# Altium footprint library ICs And Semiconductors THD.PcbLib: 350 footprints (part 17 of 22)
Each footprint in its own frame and in the unit in brackets; x right, y up, seen from the top. Pads: shape width x height; smd on the part's side, far side on the other; paste and mask are expansions set on the pad; w line width, h text height; cw(c..) or ccw(c..) is an arc to the next point about the centre after c.
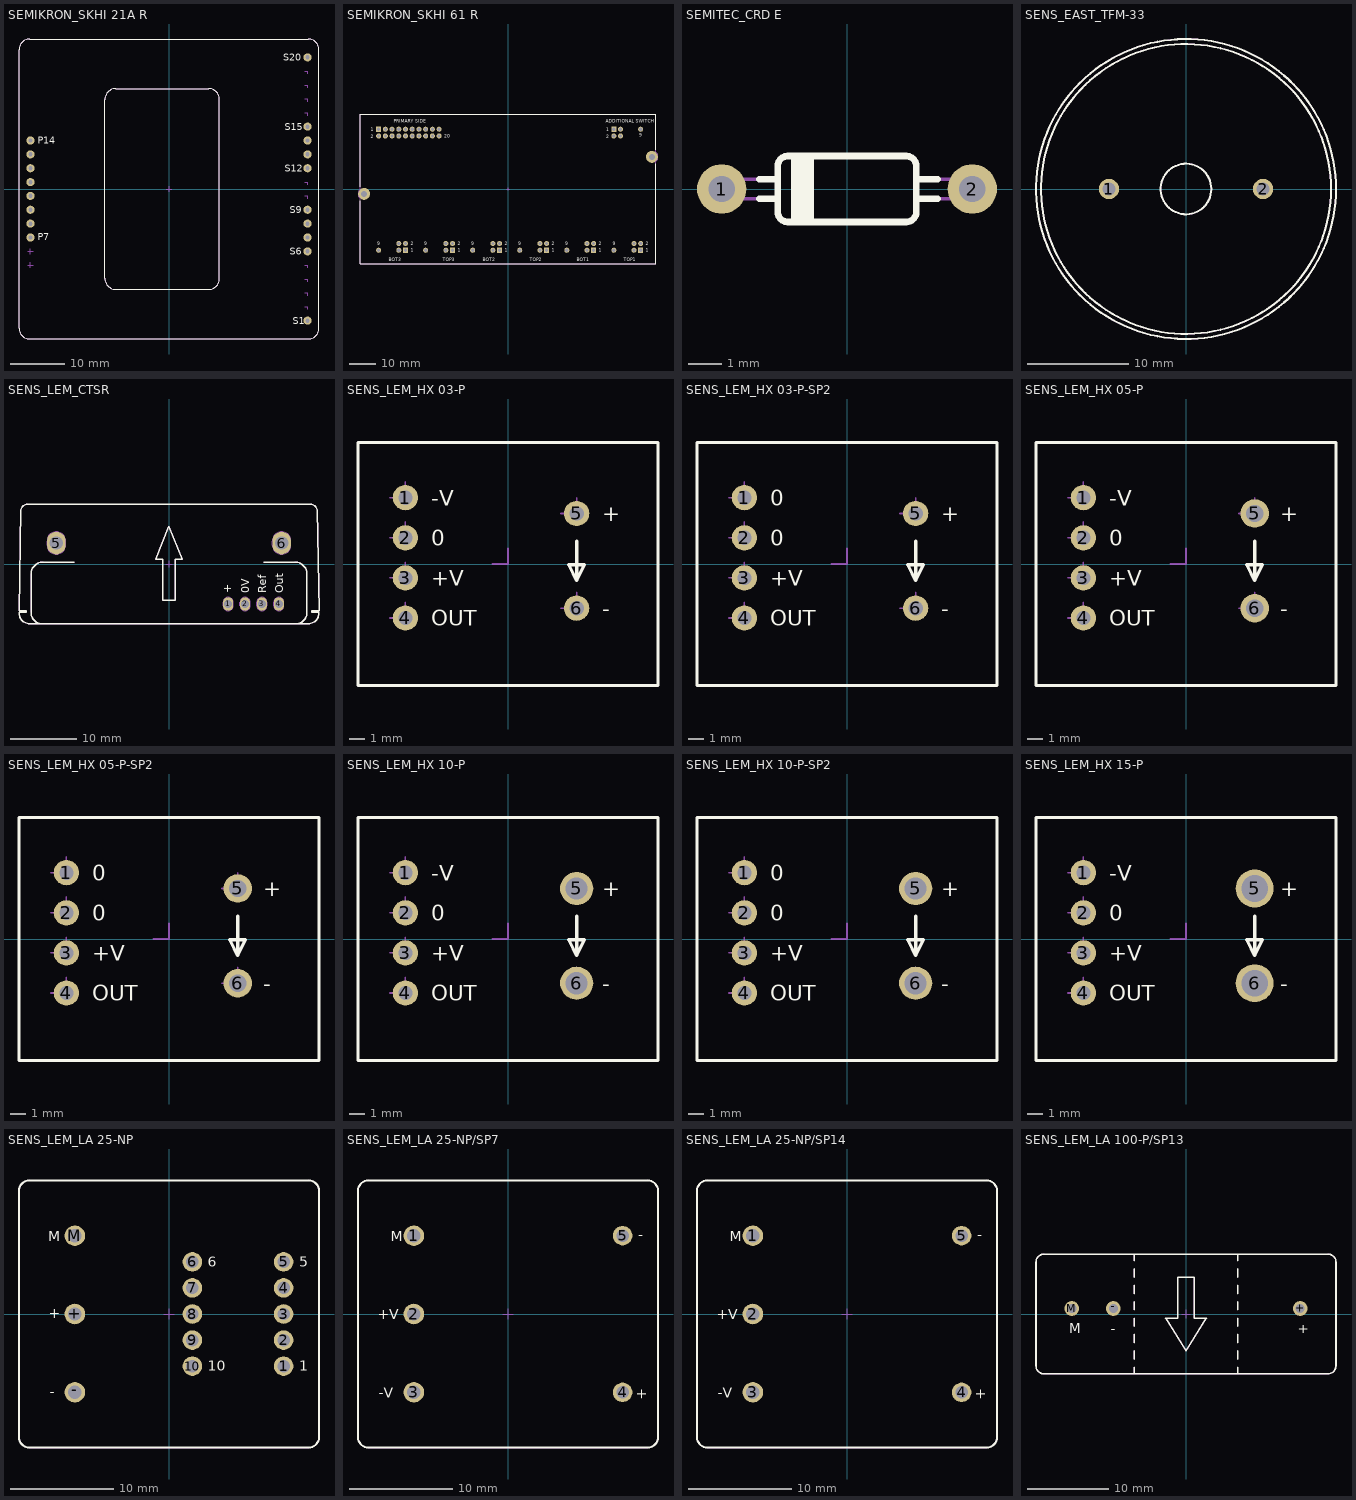
[diagram p16: the footprints below, top view; thin cyan lines are the x and y axes]

## SEMIKRON_SKHI 21A R [mm] "SEMIKRON SKHI 21A R Case"
height 16
pads (18):
  round 1.5 hole 0.8: P7(-25.4,-8.89) P8(-25.4,-6.35) P9(-25.4,-3.81) P10(-25.4,-1.27) P11(-25.4,1.27) P12(-25.4,3.81) P13(-25.4,6.35) P14(-25.4,8.89) S1(25.4,-24.13) S6(25.4,-11.43) S7(25.4,-8.89) S8(25.4,-6.35) S9(25.4,-3.81) S12(25.4,3.81) S13(25.4,6.35) S14(25.4,8.89) S15(25.4,11.43) S20(25.4,24.13)
Top Overlay:
  lines w0.2: -27.5,-25.5 ccw(c-25.5,-25.5) -25.5,-27.5 25.5,-27.5 ccw(c25.5,-25.5) 27.5,-25.5 27.5,25.5 ccw(c25.5,25.5) 25.5,27.5 -25.5,27.5 ccw(c-25.5,25.5) -27.5,25.5 -27.5,-25.5 ; -11.75,-16.4 ccw(c-9.75,-16.4) -9.75,-18.4 7.25,-18.4 ccw(c7.25,-16.4) 9.25,-16.4 9.25,16.4 ccw(c7.25,16.4) 7.25,18.4 -9.75,18.4 ccw(c-9.75,16.4) -11.75,16.4 -11.75,-16.4
  text "P7" at -24.08,-9.44 h1.27
  text "P14" at -24.08,8.34 h1.27
  text "S20" at 20.98,23.48 h1.27
  text "S15" at 21.18,10.78 h1.27
  text "S12" at 21.227,3.16 h1.27
  text "S9" at 22.18,-4.46 h1.27
  text "S6" at 22.18,-12.08 h1.27
  text "S1" at 22.68,-24.78 h1.27
Notvisible:
  lines w0.1: -25.9,-13.97 -25.4,-13.97 ; -25.9,-11.43 -25.4,-11.43 ; -25.9,-8.89 -25.4,-8.89 ; -25.9,-6.35 -25.4,-6.35 ; -25.9,-3.81 -25.4,-3.81 ; -25.9,-1.27 -25.4,-1.27 ; -25.9,1.27 -25.4,1.27 ; -25.9,3.81 -25.4,3.81 ; -25.9,6.35 -25.4,6.35 ; -25.9,8.89 -25.4,8.89 ; -25.4,-14.47 -25.4,-13.97 ; -25.4,-13.47 -25.4,-13.97 ; -25.4,-11.93 -25.4,-11.43 ; -25.4,-10.93 -25.4,-11.43 ; -25.4,-9.39 -25.4,-8.89 ; -25.4,-8.39 -25.4,-8.89 ; -25.4,-6.85 -25.4,-6.35 ; -25.4,-5.85 -25.4,-6.35 ; -25.4,-4.31 -25.4,-3.81 ; -25.4,-3.31 -25.4,-3.81 ; -25.4,-1.77 -25.4,-1.27 ; -25.4,-0.77 -25.4,-1.27 ; -25.4,0.77 -25.4,1.27 ; -25.4,1.77 -25.4,1.27 ; -25.4,3.31 -25.4,3.81 ; -25.4,4.31 -25.4,3.81 ; -25.4,5.85 -25.4,6.35 ; -25.4,6.85 -25.4,6.35 ; -25.4,8.39 -25.4,8.89 ; -25.4,9.39 -25.4,8.89 ; -24.9,-13.97 -25.4,-13.97 ; -24.9,-11.43 -25.4,-11.43 ; -24.9,-8.89 -25.4,-8.89 ; -24.9,-6.35 -25.4,-6.35 ; -24.9,-3.81 -25.4,-3.81 ; -24.9,-1.27 -25.4,-1.27 ; -24.9,1.27 -25.4,1.27 ; -24.9,3.81 -25.4,3.81 ; -24.9,6.35 -25.4,6.35 ; -24.9,8.89 -25.4,8.89 ; -0.5,0 0,0 ; 0,-0.5 0,0 ; 0,0.5 0,0 ; 0.5,0 0,0 ; 24.9,-24.13 25.4,-24.13 ; 24.9,-21.59 25.4,-21.59 25.4,-22.09 ; 24.9,-19.05 25.4,-19.05 25.4,-19.55 ; 24.9,-16.51 25.4,-16.51 25.4,-17.01 ; 24.9,-13.97 25.4,-13.97 25.4,-14.47 ; 24.9,-11.43 25.4,-11.43 ; 24.9,-8.89 25.4,-8.89 ; 24.9,-6.35 25.4,-6.35 ; 24.9,-3.81 25.4,-3.81 ; 24.9,-1.27 25.4,-1.27 25.4,-1.77 ; 24.9,1.27 25.4,1.27 25.4,0.77 ; 24.9,3.81 25.4,3.81 ; 24.9,6.35 25.4,6.35 ; 24.9,8.89 25.4,8.89 ; 24.9,11.43 25.4,11.43 ; 24.9,13.97 25.4,13.97 25.4,13.47 ; 24.9,16.51 25.4,16.51 25.4,16.01 ; 24.9,19.05 25.4,19.05 25.4,18.55 ; 24.9,21.59 25.4,21.59 25.4,21.09 ; 24.9,24.13 25.4,24.13 ; 25.4,-24.63 25.4,-24.13 ; 25.4,-23.63 25.4,-24.13 ; 25.4,-11.93 25.4,-11.43 ; 25.4,-10.93 25.4,-11.43 ; 25.4,-9.39 25.4,-8.89 ; 25.4,-8.39 25.4,-8.89 ; 25.4,-6.85 25.4,-6.35 ; 25.4,-5.85 25.4,-6.35 ; 25.4,-4.31 25.4,-3.81 ; 25.4,-3.31 25.4,-3.81 ; 25.4,3.31 25.4,3.81 ; 25.4,4.31 25.4,3.81 ; 25.4,5.85 25.4,6.35 ; 25.4,6.85 25.4,6.35 ; 25.4,8.39 25.4,8.89 ; 25.4,9.39 25.4,8.89 ; 25.4,10.93 25.4,11.43 ; 25.4,11.93 25.4,11.43 ; 25.4,23.63 25.4,24.13 ; 25.4,24.63 25.4,24.13 ; 25.9,-24.13 25.4,-24.13 ; 25.9,-11.43 25.4,-11.43 ; 25.9,-8.89 25.4,-8.89 ; 25.9,-6.35 25.4,-6.35 ; 25.9,-3.81 25.4,-3.81 ; 25.9,3.81 25.4,3.81 ; 25.9,6.35 25.4,6.35 ; 25.9,8.89 25.4,8.89 ; 25.9,11.43 25.4,11.43 ; 25.9,24.13 25.4,24.13
Mechanical 14:
  lines w0.1: -27.5,-25.5 ccw(c-25.5,-25.5) -25.5,-27.5 25.5,-27.5 ccw(c25.5,-25.5) 27.5,-25.5 27.5,25.5 ccw(c25.5,25.5) 25.5,27.5 -25.5,27.5 ccw(c-25.5,25.5) -27.5,25.5 -27.5,-25.5 ; -11.75,-16.4 ccw(c-9.75,-16.4) -9.75,-18.4 7.25,-18.4 ccw(c7.25,-16.4) 9.25,-16.4 9.25,16.4 ccw(c7.25,16.4) 7.25,18.4 -9.75,18.4 ccw(c-9.75,16.4) -11.75,16.4 -11.75,-16.4
  text "P7" at -24.08,-9.44 h1.27
  text "P14" at -24.08,8.34 h1.27
  text "S20" at 20.98,23.48 h1.27
  text "S15" at 21.18,10.78 h1.27
  text "S12" at 21.227,3.16 h1.27
  text "S9" at 22.18,-4.46 h1.27
  text "S6" at 22.18,-12.08 h1.27
  text "S1" at 22.68,-24.78 h1.27
3D body "SEMIKRON_SKHI 21A R.stp": height 16, standoff -3.5, extent -27.5,-27.5 27.5,27.5

## SEMIKRON_SKHI 61 R [mm] "SEMIKRON SKHI 61 R Case"
height 20
pads (57):
  rect 1.9x1.9 hole 1.2: 1(-48.9,22.59) AS-1(40,22.59) B1-1(32.38,-23.15) B2-1(-3.18,-23.15) B3-1(-38.74,-23.15) T1-1(50.16,-23.15) T2-1(14.6,-23.15) T3-1(-20.96,-23.15)
  round 1.9 hole 1.2: 2(-48.9,20.05) 3(-46.36,22.59) 4(-46.36,20.05) 5(-43.82,22.59) 6(-43.82,20.05) 7(-41.28,22.59) 8(-41.28,20.05) 9(-38.74,22.59) 10(-38.74,20.05) 11(-36.2,22.59) 12(-36.2,20.05) 13(-33.66,22.59) 14(-33.66,20.05) 15(-31.12,22.59) 16(-31.12,20.05) 17(-28.58,22.59) 18(-28.58,20.05) 19(-26.04,22.59) 20(-26.04,20.05) AS-2(40,20.05) AS-3(42.54,22.59) AS-4(42.54,20.05) AS-9(50.16,22.59) B1-2(32.38,-20.61) B1-3(29.84,-23.15) B1-4(29.84,-20.61) B1-9(22.22,-23.15) B2-2(-3.18,-20.61) B2-3(-5.72,-23.15) B2-4(-5.72,-20.61) B2-9(-13.34,-23.15) B3-2(-38.74,-20.61) B3-3(-41.28,-23.15) B3-4(-41.28,-20.61) B3-9(-48.9,-23.15) T1-2(50.16,-20.61) T1-3(47.62,-23.15) T1-4(47.62,-20.61) T1-9(40,-23.15) T2-2(14.6,-20.61) T2-3(12.06,-23.15) T2-4(12.06,-20.61) T2-9(4.44,-23.15) T3-2(-20.96,-20.61) T3-3(-23.5,-23.15) T3-4(-23.5,-20.61) T3-9(-31.12,-23.15)
  round 4.5 hole 2.2: MECH1(-54.4,-1.85) MECH2(54.4,12.15)
Top Overlay:
  lines w0.2: -55.9,-4.506 -55.9,-28.35 55.9,-28.35 55.9,9.494 ; -55.9,0.806 -55.9,28.35 55.9,28.35 55.9,14.806
  text "20" at -24.11,19.4 h1.2
  text "1" at -51.8,21.79 h1.2
  text "2" at -51.8,19.25 h1.2
  text "PRIMARY SIDE" at -43.15,25.04 h1.2
  text "ADDITIONAL SWITCH" at 36.86,25.04 h1.2
  text "BOT3" at -45.06,-27.32 h1.2
  text "TOP3" at -24.74,-27.32 h1.2
  text "BOT2" at -9.5,-27.32 h1.2
  text "TOP2" at 8.28,-27.32 h1.2
  text "BOT1" at 26.06,-27.32 h1.2
  text "TOP1" at 43.84,-27.32 h1.2
  text "1" at -36.81,-23.8 h1.2
  text "2" at -36.81,-21.26 h1.2
  text "2" at -19.03,-21.26 h1.2
  text "1" at -19.03,-23.8 h1.2
  text "2" at -1.25,-21.26 h1.2
  text "1" at -1.25,-23.8 h1.2
  text "2" at 16.53,-21.26 h1.2
  text "1" at 16.53,-23.8 h1.2
  text "2" at 34.31,-21.26 h1.2
  text "1" at 34.31,-23.8 h1.2
  text "2" at 52.09,-21.26 h1.2
  text "1" at 52.09,-23.8 h1.2
  text "9" at -31.606,-21.26 h1.2
  text "9" at -49.386,-21.26 h1.2
  text "9" at -13.826,-21.26 h1.2
  text "9" at 3.954,-21.26 h1.2
  text "9" at 21.734,-21.26 h1.2
  text "9" at 39.514,-21.26 h1.2
  text "9" at 49.674,19.67 h1.2
  text "2" at 37.1,19.25 h1.2
  text "1" at 37.1,21.79 h1.2
Notvisible:
  drawing of 232 lines, arcs and shapes, not listed
Mechanical 14:
  lines w0.1: -55.9,-28.35 55.9,-28.35 55.9,10.406 ccw(c54.4,12.15) 55.9,13.894 55.9,28.35 -55.9,28.35 -55.9,-0.106 ccw(c-54.4,-1.85) -55.9,-3.594 -55.9,-28.35
  text "20" at -24.11,19.4 h1.2
  text "1" at -51.8,21.79 h1.2
  text "2" at -51.8,19.25 h1.2
  text "PRIMARY SIDE" at -43.15,25.04 h1.2
  text "ADDITIONAL SWITCH" at 36.86,25.04 h1.2
  text "BOT3" at -45.06,-27.32 h1.2
  text "TOP3" at -24.74,-27.32 h1.2
  text "BOT2" at -9.5,-27.32 h1.2
  text "TOP2" at 8.28,-27.32 h1.2
  text "BOT1" at 26.06,-27.32 h1.2
  text "TOP1" at 43.84,-27.32 h1.2
  text "1" at -36.81,-23.8 h1.2
  text "2" at -36.81,-21.26 h1.2
  text "2" at -19.03,-21.26 h1.2
  text "1" at -19.03,-23.8 h1.2
  text "2" at -1.25,-21.26 h1.2
  text "1" at -1.25,-23.8 h1.2
  text "2" at 16.53,-21.26 h1.2
  text "1" at 16.53,-23.8 h1.2
  text "2" at 34.31,-21.26 h1.2
  text "1" at 34.31,-23.8 h1.2
  text "2" at 52.09,-21.26 h1.2
  text "1" at 52.09,-23.8 h1.2
  text "9" at -31.606,-21.26 h1.2
  text "9" at -49.386,-21.26 h1.2
  text "9" at -13.826,-21.26 h1.2
  text "9" at 3.954,-21.26 h1.2
  text "9" at 21.734,-21.26 h1.2
  text "9" at 39.514,-21.26 h1.2
  text "9" at 49.674,19.67 h1.2
  text "2" at 37.1,19.25 h1.2
  text "1" at 37.1,21.79 h1.2
3D body "SEMIKRON_SKHI 61 R.stp": height 20, standoff -3.2, extent -56.7,-28.35 56.7,28.35

## SEMITEC_CRD E [mm] "CRD Diode, Lead spacing 7.62mm Body 4.2mm X 2mm, SEMITEC Case Type CRD E"
height 2
pads (2):
  round 1.5 hole 0.8: 1(-3.8,0) 2(3.8,0)
Top Overlay:
  lines w0.2: -2.66,-0.3 -2.1,-0.3 ; -2.66,0.3 -2.1,0.3 ; -1.6,-1 -1.6,1 ; -1.5,-1 -1.5,1 ; -1.4,-1 -1.4,1 ; -1.3,-1 -1.3,1 ; -1.2,-1 -1.2,1 ; -1.1,-1 -1.1,1 ; 2.1,-0.3 2.752,-0.3 ; 2.1,0.3 2.752,0.3 ; -2.1,-0.7 ccw(c-1.8,-0.7) -1.8,-1 1.8,-1 ccw(c1.8,-0.7) 2.1,-0.7 2.1,0.7 ccw(c1.8,0.7) 1.8,1 -1.8,1 ccw(c-1.8,0.7) -2.1,0.7 -2.1,-0.7
Mechanical 14:
  lines w0.1: -2.1,-0.3 -3.81,-0.3 cw(c-3.81,0) -3.81,0.3 -2.1,0.3 ; -1.6,-1 -1.6,1 ; -1.55,-1 -1.55,1 ; -1.5,-1 -1.5,1 ; -1.45,-1 -1.45,1 ; -1.4,-1 -1.4,1 ; -1.35,-1 -1.35,1 ; -1.3,-1 -1.3,1 ; -1.25,-1 -1.25,1 ; -1.2,-1 -1.2,1 ; -1.15,-1 -1.15,1 ; -1.1,-1 -1.1,1 ; 2.1,-0.3 3.81,-0.3 ccw(c3.81,0) 3.81,0.3 2.1,0.3 ; -2.1,-0.7 ccw(c-1.8,-0.7) -1.8,-1 1.8,-1 ccw(c1.8,-0.7) 2.1,-0.7 2.1,0.7 ccw(c1.8,0.7) 1.8,1 -1.8,1 ccw(c-1.8,0.7) -2.1,0.7 -2.1,-0.7
3D body "E-103.stp": height 2, standoff -3.1, extent -4.11,-1 4.11,1

## SENS_EAST_TFM-33 [mm] "EAST Piezo Transducer, Body Dia. 29.6mm, Pitch 15.2mm"
height 7.5
pads (2):
  round 2 hole 1.3: 1(-7.6,0) 2(7.6,0)
Top Overlay:
  circle w0.2: c0,0 r2.5
  circle w0.2: c0,0 r14.3
  circle w0.2: c0,0 r14.8
Mechanical 14:
  circle w0.1: c0,0 r14.8
  circle w0.1: c0,0 r14.3
  circle w0.1: c0,0 r2.5
  circle w0.1: c7.6,0 r0.5
  circle w0.1: c-7.6,0 r0.5
3D body "SENS_EAST_TFM-33.stp": height 7.5, standoff -3.6, extent -14.8,-14.778 14.8,14.778

## SENS_LEM_CTSR [mm] "LEM Current Transducer, Body 45x17.9mm, CTSR Series"
height 44.6
pads (6):
  oval 1.524x2.032 hole 1.2: 1(8.868,-6) 2(11.408,-6) 3(13.948,-6) 4(16.488,-6)
  oval 2.8x3.4 hole 2: 5(-16.902,3.15) 6(16.898,3.15)
Top Overlay:
  lines w0.2: -19.07,-8.95 cw(c-19.057,-7.317) -20.687,-7.23 -20.687,-1.5 cw(c-18.887,-1.5) -18.887,0.3 -14.188,0.3 ; 14.188,0.3 18.887,0.3 cw(c18.887,-1.5) 20.687,-1.5 20.687,-7.23 cw(c19.057,-7.317) 19.07,-8.95 ; -22.505,-7 -21.395,-6.989 -21.4,-7.239 -22.5,-7.25 -22.495,-7.406 ccw(c-20.896,-7.35) -20.896,-8.95 20.896,-8.95 ccw(c20.896,-7.35) 22.495,-7.406 22.5,-7.25 21.4,-7.25 21.396,-7 22.505,-7 22.24,8.15 ccw(c21.23,7.913) 21.244,8.95 -21.244,8.95 ccw(c-21.244,7.95) -22.223,8.15 -22.505,-7 ; -2.004,0.75 -0.005,5.699 2.004,0.75 0.909,0.75 0.909,-5.45 -0.909,-5.45 -0.909,0.75 -2.004,0.75
  text "Out" at 17.113,-4.385 h1.2
  text "Ref" at 14.573,-4.385 h1.2
  text "0V" at 12.033,-4.385 h1.2
  text "+" at 9.368,-4.36 h1.2
Notvisible:
  circle w0.1: c8.868,-6 r0.6
  circle w0.1: c11.408,-6 r0.6
  circle w0.1: c13.948,-6 r0.6
  circle w0.1: c16.488,-6 r0.6
  circle w0.1: c16.898,3.15 r1
  circle w0.1: c-16.902,3.15 r1
  lines w0.1: -17.402,2.85 -16.902,2.85 ; -17.402,3.45 -16.902,3.45 ; -17.256,2.796 -16.902,3.15 ; -17.256,3.504 -16.902,3.15 ; -16.902,2.35 -16.902,2.85 ; -16.902,3.95 -16.902,3.45 ; -16.549,2.796 -16.902,3.15 ; -16.549,3.504 -16.902,3.15 ; -16.402,2.85 -16.902,2.85 ; -16.402,3.45 -16.902,3.45 ; -0.5,0 0,0 ; 0,-0.5 0,0 ; 0,0.5 0,0 ; 0.5,0 0,0 ; 8.368,-6.262 8.868,-6.262 ; 8.368,-5.746 8.868,-5.746 ; 8.514,-6.354 8.868,-6 ; 8.514,-5.646 8.868,-6 ; 8.868,-6.762 8.868,-6.262 ; 8.868,-5.246 8.868,-5.746 ; 9.221,-6.354 8.868,-6 ; 9.221,-5.646 8.868,-6 ; 9.368,-6.262 8.868,-6.262 ; 9.368,-5.746 8.868,-5.746 ; 10.908,-6.262 11.408,-6.262 ; 10.908,-5.746 11.408,-5.746 ; 11.054,-6.354 11.408,-6 ; 11.054,-5.646 11.408,-6 ; 11.408,-6.762 11.408,-6.262 ; 11.408,-5.246 11.408,-5.746 ; 11.761,-6.354 11.408,-6 ; 11.761,-5.646 11.408,-6 ; 11.908,-6.262 11.408,-6.262 ; 11.908,-5.746 11.408,-5.746 ; 13.448,-6.262 13.948,-6.262 ; 13.448,-5.746 13.948,-5.746 ; 13.594,-6.354 13.948,-6 ; 13.594,-5.646 13.948,-6 ; 13.948,-6.762 13.948,-6.262 ; 13.948,-5.246 13.948,-5.746 ; 14.301,-6.354 13.948,-6 ; 14.301,-5.646 13.948,-6 ; 14.448,-6.262 13.948,-6.262 ; 14.448,-5.746 13.948,-5.746 ; 15.988,-6.262 16.488,-6.262 ; 15.988,-5.746 16.488,-5.746 ; 16.134,-6.354 16.488,-6 ; 16.134,-5.646 16.488,-6 ; 16.398,2.85 16.898,2.85 ; 16.398,3.45 16.898,3.45 ; 16.488,-6.762 16.488,-6.262 ; 16.488,-5.246 16.488,-5.746 ; 16.544,2.796 16.898,3.15 ; 16.544,3.504 16.898,3.15 ; 16.841,-6.354 16.488,-6 ; 16.841,-5.646 16.488,-6 ; 16.898,2.35 16.898,2.85 ; 16.898,3.95 16.898,3.45 ; 16.988,-6.262 16.488,-6.262 ; 16.988,-5.746 16.488,-5.746 ; 17.251,2.796 16.898,3.15 ; 17.251,3.504 16.898,3.15 ; 17.398,2.85 16.898,2.85 ; 17.398,3.45 16.898,3.45 ; -18.302,2.85 ccw(c-16.902,2.85) -15.502,2.85 -15.502,3.45 ccw(c-16.902,3.45) -18.302,3.45 -18.302,2.85 ; 8.106,-6.262 ccw(c8.868,-6.262) 9.63,-6.262 9.63,-5.746 ccw(c8.868,-5.746) 8.106,-5.746 8.106,-6.262 ; 10.646,-6.262 ccw(c11.408,-6.262) 12.17,-6.262 12.17,-5.746 ccw(c11.408,-5.746) 10.646,-5.746 10.646,-6.262 ; 13.186,-6.262 ccw(c13.948,-6.262) 14.71,-6.262 14.71,-5.746 ccw(c13.948,-5.746) 13.186,-5.746 13.186,-6.262 ; 15.498,2.85 ccw(c16.898,2.85) 18.298,2.85 18.298,3.45 ccw(c16.898,3.45) 15.498,3.45 15.498,2.85 ; 15.726,-6.262 ccw(c16.488,-6.262) 17.25,-6.262 17.25,-5.746 ccw(c16.488,-5.746) 15.726,-5.746 15.726,-6.262
Mechanical 14:
  lines w0.1: -19.07,-8.95 cw(c-19.057,-7.317) -20.687,-7.23 -20.687,-1.5 cw(c-18.887,-1.5) -18.887,0.3 -14.188,0.3 ; 14.188,0.3 18.887,0.3 cw(c18.887,-1.5) 20.687,-1.5 20.687,-7.23 cw(c19.057,-7.317) 19.07,-8.95 ; -22.505,-7 -21.395,-6.989 -21.4,-7.239 -22.5,-7.25 -22.495,-7.406 ccw(c-20.896,-7.35) -20.896,-8.95 20.896,-8.95 ccw(c20.896,-7.35) 22.495,-7.406 22.5,-7.25 21.4,-7.25 21.396,-7 22.505,-7 22.24,8.15 ccw(c21.23,7.913) 21.244,8.95 -21.244,8.95 ccw(c-21.244,7.95) -22.223,8.15 -22.505,-7 ; -2.004,0.75 -0.005,5.699 2.004,0.75 0.909,0.75 0.909,-5.45 -0.909,-5.45 -0.909,0.75 -2.004,0.75
  text "Out" at 17.113,-4.385 h1.2
  text "Ref" at 14.573,-4.385 h1.2
  text "0V" at 12.033,-4.385 h1.2
  text "+" at 9.368,-4.36 h1.2
3D body "SENS_LEM_CTSR.stp": height 44.56, standoff -3.5, extent -22.505,-8.95 22.505,8.95

## SENS_LEM_HX 03-P [mm] "LEM Current Transducer, Body 19x15.4mm (max)"
height 20
pads (6):
  round 1.6 hole 0.9: 1(-6.5,4.2) 2(-6.5,1.66) 3(-6.5,-0.88) 4(-6.5,-3.42) 5(4.35,3.2) 6(4.35,-2.8)
Top Overlay:
  lines w0.2: 4.35,1.45 4.35,-1.05 ; 4.35,-1.05 3.85,-0.05 4.85,-0.05 4.35,-1.05 ; -9.5,-7.7 9.5,-7.7 9.5,7.7 -9.5,7.7 -9.5,-7.7
  text "-V" at -4.865,3.7 h1
  text "0" at -4.865,1.16 h1
  text "+V" at -4.865,-1.38 h1
  text "OUT" at -4.865,-3.92 h1
  text "+" at 5.985,2.7 h1
  text "-" at 5.985,-3.3 h1
Notvisible:
  circle w0.1: c4.35,3.2 r0.3
  circle w0.1: c4.35,-2.8 r0.3
  lines w0.1: -7.5,-3.42 -6.5,-3.42 -6.5,-2.42 ; -7.5,-0.88 -6.5,-0.88 -6.5,0.12 ; -7.5,1.66 -6.5,1.66 -6.5,2.66 ; -7.5,4.2 -6.5,4.2 -6.5,5.2 ; -1,0 0,0 0,1 ; 3.35,-2.8 4.35,-2.8 4.35,-1.8 ; 3.35,3.2 4.35,3.2 4.35,4.2 ; -6.625,-3.67 -6.375,-3.67 -6.375,-3.17 -6.625,-3.17 -6.625,-3.67 ; -6.625,-1.13 -6.375,-1.13 -6.375,-0.63 -6.625,-0.63 -6.625,-1.13 ; -6.625,1.41 -6.375,1.41 -6.375,1.91 -6.625,1.91 -6.625,1.41 ; -6.625,3.95 -6.375,3.95 -6.375,4.45 -6.625,4.45 -6.625,3.95
Mechanical 14:
  lines w0.1: 4.35,1.45 4.35,-1.05 ; 4.35,-1.05 4.85,-0.05 3.85,-0.05 4.35,-1.05 ; -9.5,-7.7 -9.5,7.7 9.5,7.7 9.5,-7.7 -9.5,-7.7
  text "OUT" at -4.865,-3.92 h1
  text "+V" at -4.865,-1.38 h1
  text "0" at -4.865,1.16 h1
  text "-V" at -4.865,3.7 h1
  text "+" at 5.985,2.7 h1
  text "-" at 5.985,-3.3 h1
3D body "SENS_LEM_HX 03-P.stp": height 20, standoff -4, extent -9.5,-7.7 9.5,7.7

## SENS_LEM_HX 03-P-SP2 [mm] "LEM Current Transducer, Body 19x15.4mm (max)"
height 20
pads (6):
  round 1.6 hole 0.9: 1(-6.5,4.2) 2(-6.5,1.66) 3(-6.5,-0.88) 4(-6.5,-3.42) 5(4.35,3.2) 6(4.35,-2.8)
Top Overlay:
  lines w0.2: 4.35,1.45 4.35,-1.05 ; 4.35,-1.05 4.85,-0.05 3.85,-0.05 4.35,-1.05 ; -9.5,-7.7 -9.5,7.7 9.5,7.7 9.5,-7.7 -9.5,-7.7
  text "-" at 5.985,-3.3 h1
  text "+" at 5.985,2.7 h1
  text "OUT" at -4.865,-3.92 h1
  text "+V" at -4.865,-1.38 h1
  text "0" at -4.865,1.16 h1
  text "0" at -4.865,3.7 h1
Notvisible:
  circle w0.1: c4.35,-2.8 r0.3
  circle w0.1: c4.35,3.2 r0.3
  lines w0.1: -7.5,-3.42 -6.5,-3.42 -6.5,-2.42 ; -7.5,-0.88 -6.5,-0.88 -6.5,0.12 ; -7.5,1.66 -6.5,1.66 -6.5,2.66 ; -7.5,4.2 -6.5,4.2 -6.5,5.2 ; -1,0 0,0 0,1 ; 3.35,-2.8 4.35,-2.8 4.35,-1.8 ; 3.35,3.2 4.35,3.2 4.35,4.2 ; -6.625,-3.67 -6.625,-3.17 -6.375,-3.17 -6.375,-3.67 -6.625,-3.67 ; -6.625,-1.13 -6.625,-0.63 -6.375,-0.63 -6.375,-1.13 -6.625,-1.13 ; -6.625,1.41 -6.625,1.91 -6.375,1.91 -6.375,1.41 -6.625,1.41 ; -6.625,3.95 -6.625,4.45 -6.375,4.45 -6.375,3.95 -6.625,3.95
Mechanical 14:
  lines w0.1: 4.35,1.45 4.35,-1.05 ; 4.35,-1.05 3.85,-0.05 4.85,-0.05 4.35,-1.05 ; -9.5,-7.7 9.5,-7.7 9.5,7.7 -9.5,7.7 -9.5,-7.7
  text "-" at 5.985,-3.3 h1
  text "+" at 5.985,2.7 h1
  text "0" at -4.865,3.7 h1
  text "0" at -4.865,1.16 h1
  text "+V" at -4.865,-1.38 h1
  text "OUT" at -4.865,-3.92 h1
3D body "SENS_LEM_HX 03-P-SP2.stp": height 20, standoff -4, extent -9.5,-7.7 9.5,7.7

## SENS_LEM_HX 05-P [mm] "LEM Current Transducer, Body 19x15.4mm (max)"
height 20
pads (6):
  round 1.6 hole 0.9: 1(-6.5,4.2) 2(-6.5,1.66) 3(-6.5,-0.88) 4(-6.5,-3.42)
  round 1.8 hole 1.1: 5(4.35,3.2) 6(4.35,-2.8)
Top Overlay:
  lines w0.2: 4.35,1.45 4.35,-1.05 ; 4.35,-1.05 4.85,-0.05 3.85,-0.05 4.35,-1.05 ; -9.5,-7.7 -9.5,7.7 9.5,7.7 9.5,-7.7 -9.5,-7.7
  text "-" at 5.985,-3.3 h1
  text "+" at 5.985,2.7 h1
  text "OUT" at -4.865,-3.92 h1
  text "+V" at -4.865,-1.38 h1
  text "0" at -4.865,1.16 h1
  text "-V" at -4.865,3.7 h1
Notvisible:
  circle w0.1: c4.35,-2.8 r0.3
  circle w0.1: c4.35,3.2 r0.3
  lines w0.1: -7.5,-3.42 -6.5,-3.42 -6.5,-2.42 ; -7.5,-0.88 -6.5,-0.88 -6.5,0.12 ; -7.5,1.66 -6.5,1.66 -6.5,2.66 ; -7.5,4.2 -6.5,4.2 -6.5,5.2 ; -1,0 0,0 0,1 ; 3.35,-2.8 4.35,-2.8 4.35,-1.8 ; 3.35,3.2 4.35,3.2 4.35,4.2 ; -6.625,-3.67 -6.625,-3.17 -6.375,-3.17 -6.375,-3.67 -6.625,-3.67 ; -6.625,-1.13 -6.625,-0.63 -6.375,-0.63 -6.375,-1.13 -6.625,-1.13 ; -6.625,1.41 -6.625,1.91 -6.375,1.91 -6.375,1.41 -6.625,1.41 ; -6.625,3.95 -6.625,4.45 -6.375,4.45 -6.375,3.95 -6.625,3.95
Mechanical 14:
  lines w0.1: 4.35,1.45 4.35,-1.05 ; 4.35,-1.05 3.85,-0.05 4.85,-0.05 4.35,-1.05 ; -9.5,-7.7 9.5,-7.7 9.5,7.7 -9.5,7.7 -9.5,-7.7
  text "-" at 5.985,-3.3 h1
  text "+" at 5.985,2.7 h1
  text "-V" at -4.865,3.7 h1
  text "0" at -4.865,1.16 h1
  text "+V" at -4.865,-1.38 h1
  text "OUT" at -4.865,-3.92 h1
3D body "SENS_LEM_HX 05-P.stp": height 20, standoff -4, extent -9.5,-7.7 9.5,7.7

## SENS_LEM_HX 05-P-SP2 [mm] "LEM Current Transducer, Body 19x15.4mm (max)"
height 20
pads (6):
  round 1.6 hole 0.9: 1(-6.5,4.2) 2(-6.5,1.66) 3(-6.5,-0.88) 4(-6.5,-3.42)
  round 1.8 hole 1.1: 5(4.35,3.2) 6(4.35,-2.8)
Top Overlay:
  lines w0.2: 4.35,1.45 4.35,-1.05 ; 4.35,-1.05 3.85,-0.05 4.85,-0.05 4.35,-1.05 ; -9.5,-7.7 9.5,-7.7 9.5,7.7 -9.5,7.7 -9.5,-7.7
  text "0" at -4.865,3.7 h1
  text "0" at -4.865,1.16 h1
  text "+V" at -4.865,-1.38 h1
  text "OUT" at -4.865,-3.92 h1
  text "+" at 5.985,2.7 h1
  text "-" at 5.985,-3.3 h1
Notvisible:
  circle w0.1: c4.35,3.2 r0.3
  circle w0.1: c4.35,-2.8 r0.3
  lines w0.1: -7.5,-3.42 -6.5,-3.42 -6.5,-2.42 ; -7.5,-0.88 -6.5,-0.88 -6.5,0.12 ; -7.5,1.66 -6.5,1.66 -6.5,2.66 ; -7.5,4.2 -6.5,4.2 -6.5,5.2 ; -1,0 0,0 0,1 ; 3.35,-2.8 4.35,-2.8 4.35,-1.8 ; 3.35,3.2 4.35,3.2 4.35,4.2 ; -6.625,-3.67 -6.375,-3.67 -6.375,-3.17 -6.625,-3.17 -6.625,-3.67 ; -6.625,-1.13 -6.375,-1.13 -6.375,-0.63 -6.625,-0.63 -6.625,-1.13 ; -6.625,1.41 -6.375,1.41 -6.375,1.91 -6.625,1.91 -6.625,1.41 ; -6.625,3.95 -6.375,3.95 -6.375,4.45 -6.625,4.45 -6.625,3.95
Mechanical 14:
  lines w0.1: 4.35,1.45 4.35,-1.05 ; 4.35,-1.05 4.85,-0.05 3.85,-0.05 4.35,-1.05 ; -9.5,-7.7 -9.5,7.7 9.5,7.7 9.5,-7.7 -9.5,-7.7
  text "OUT" at -4.865,-3.92 h1
  text "+V" at -4.865,-1.38 h1
  text "0" at -4.865,1.16 h1
  text "0" at -4.865,3.7 h1
  text "+" at 5.985,2.7 h1
  text "-" at 5.985,-3.3 h1
3D body "SENS_LEM_HX 05-P-SP2.stp": height 20, standoff -4, extent -9.5,-7.7 9.5,7.7

## SENS_LEM_HX 10-P [mm] "LEM Current Transducer, Body 19x15.4mm (max)"
height 20
pads (6):
  round 1.6 hole 0.9: 1(-6.5,4.2) 2(-6.5,1.66) 3(-6.5,-0.88) 4(-6.5,-3.42)
  round 2.1 hole 1.4: 5(4.35,3.2) 6(4.35,-2.8)
Top Overlay:
  lines w0.2: 4.35,1.45 4.35,-1.05 ; 4.35,-1.05 4.85,-0.05 3.85,-0.05 4.35,-1.05 ; -9.5,-7.7 -9.5,7.7 9.5,7.7 9.5,-7.7 -9.5,-7.7
  text "-" at 5.985,-3.3 h1
  text "+" at 5.985,2.7 h1
  text "OUT" at -4.865,-3.92 h1
  text "+V" at -4.865,-1.38 h1
  text "0" at -4.865,1.16 h1
  text "-V" at -4.865,3.7 h1
Notvisible:
  circle w0.1: c4.35,-2.8 r0.3
  circle w0.1: c4.35,3.2 r0.3
  lines w0.1: -7.5,-3.42 -6.5,-3.42 -6.5,-2.42 ; -7.5,-0.88 -6.5,-0.88 -6.5,0.12 ; -7.5,1.66 -6.5,1.66 -6.5,2.66 ; -7.5,4.2 -6.5,4.2 -6.5,5.2 ; -1,0 0,0 0,1 ; 3.35,-2.8 4.35,-2.8 4.35,-1.8 ; 3.35,3.2 4.35,3.2 4.35,4.2 ; -6.625,-3.67 -6.625,-3.17 -6.375,-3.17 -6.375,-3.67 -6.625,-3.67 ; -6.625,-1.13 -6.625,-0.63 -6.375,-0.63 -6.375,-1.13 -6.625,-1.13 ; -6.625,1.41 -6.625,1.91 -6.375,1.91 -6.375,1.41 -6.625,1.41 ; -6.625,3.95 -6.625,4.45 -6.375,4.45 -6.375,3.95 -6.625,3.95
Mechanical 14:
  lines w0.1: 4.35,1.45 4.35,-1.05 ; 4.35,-1.05 3.85,-0.05 4.85,-0.05 4.35,-1.05 ; -9.5,-7.7 9.5,-7.7 9.5,7.7 -9.5,7.7 -9.5,-7.7
  text "-" at 5.985,-3.3 h1
  text "+" at 5.985,2.7 h1
  text "-V" at -4.865,3.7 h1
  text "0" at -4.865,1.16 h1
  text "+V" at -4.865,-1.38 h1
  text "OUT" at -4.865,-3.92 h1
3D body "SENS_LEM_HX 10-P.stp": height 20, standoff -4, extent -9.5,-7.7 9.5,7.7

## SENS_LEM_HX 10-P-SP2 [mm] "LEM Current Transducer, Body 19x15.4mm (max)"
height 20
pads (6):
  round 1.6 hole 0.9: 1(-6.5,4.2) 2(-6.5,1.66) 3(-6.5,-0.88) 4(-6.5,-3.42)
  round 2.1 hole 1.4: 5(4.35,3.2) 6(4.35,-2.8)
Top Overlay:
  lines w0.2: 4.35,1.45 4.35,-1.05 ; 4.35,-1.05 3.85,-0.05 4.85,-0.05 4.35,-1.05 ; -9.5,-7.7 9.5,-7.7 9.5,7.7 -9.5,7.7 -9.5,-7.7
  text "0" at -4.865,3.7 h1
  text "0" at -4.865,1.16 h1
  text "+V" at -4.865,-1.38 h1
  text "OUT" at -4.865,-3.92 h1
  text "+" at 5.985,2.7 h1
  text "-" at 5.985,-3.3 h1
Notvisible:
  circle w0.1: c4.35,3.2 r0.3
  circle w0.1: c4.35,-2.8 r0.3
  lines w0.1: -7.5,-3.42 -6.5,-3.42 -6.5,-2.42 ; -7.5,-0.88 -6.5,-0.88 -6.5,0.12 ; -7.5,1.66 -6.5,1.66 -6.5,2.66 ; -7.5,4.2 -6.5,4.2 -6.5,5.2 ; -1,0 0,0 0,1 ; 3.35,-2.8 4.35,-2.8 4.35,-1.8 ; 3.35,3.2 4.35,3.2 4.35,4.2 ; -6.625,-3.67 -6.375,-3.67 -6.375,-3.17 -6.625,-3.17 -6.625,-3.67 ; -6.625,-1.13 -6.375,-1.13 -6.375,-0.63 -6.625,-0.63 -6.625,-1.13 ; -6.625,1.41 -6.375,1.41 -6.375,1.91 -6.625,1.91 -6.625,1.41 ; -6.625,3.95 -6.375,3.95 -6.375,4.45 -6.625,4.45 -6.625,3.95
Mechanical 14:
  lines w0.1: 4.35,1.45 4.35,-1.05 ; 4.35,-1.05 4.85,-0.05 3.85,-0.05 4.35,-1.05 ; -9.5,-7.7 -9.5,7.7 9.5,7.7 9.5,-7.7 -9.5,-7.7
  text "OUT" at -4.865,-3.92 h1
  text "+V" at -4.865,-1.38 h1
  text "0" at -4.865,1.16 h1
  text "0" at -4.865,3.7 h1
  text "+" at 5.985,2.7 h1
  text "-" at 5.985,-3.3 h1
3D body "SENS_LEM_HX 10-P-SP2.stp": height 20, standoff -4, extent -9.5,-7.7 9.5,7.7

## SENS_LEM_HX 15-P [mm] "LEM Current Transducer, Body 19x15.4mm (max)"
height 20
pads (6):
  round 1.6 hole 0.9: 1(-6.5,4.2) 2(-6.5,1.66) 3(-6.5,-0.88) 4(-6.5,-3.42)
  round 2.4 hole 1.7: 5(4.35,3.2) 6(4.35,-2.8)
Top Overlay:
  lines w0.2: 4.35,1.45 4.35,-1.05 ; 4.35,-1.05 3.85,-0.05 4.85,-0.05 4.35,-1.05 ; -9.5,-7.7 9.5,-7.7 9.5,7.7 -9.5,7.7 -9.5,-7.7
  text "-V" at -4.865,3.7 h1
  text "0" at -4.865,1.16 h1
  text "+V" at -4.865,-1.38 h1
  text "OUT" at -4.865,-3.92 h1
  text "+" at 5.985,2.7 h1
  text "-" at 5.985,-3.3 h1
Notvisible:
  circle w0.1: c4.35,3.2 r0.3
  circle w0.1: c4.35,-2.8 r0.3
  lines w0.1: -7.5,-3.42 -6.5,-3.42 -6.5,-2.42 ; -7.5,-0.88 -6.5,-0.88 -6.5,0.12 ; -7.5,1.66 -6.5,1.66 -6.5,2.66 ; -7.5,4.2 -6.5,4.2 -6.5,5.2 ; -1,0 0,0 0,1 ; 3.35,-2.8 4.35,-2.8 4.35,-1.8 ; 3.35,3.2 4.35,3.2 4.35,4.2 ; -6.625,-3.67 -6.375,-3.67 -6.375,-3.17 -6.625,-3.17 -6.625,-3.67 ; -6.625,-1.13 -6.375,-1.13 -6.375,-0.63 -6.625,-0.63 -6.625,-1.13 ; -6.625,1.41 -6.375,1.41 -6.375,1.91 -6.625,1.91 -6.625,1.41 ; -6.625,3.95 -6.375,3.95 -6.375,4.45 -6.625,4.45 -6.625,3.95
Mechanical 14:
  lines w0.1: 4.35,1.45 4.35,-1.05 ; 4.35,-1.05 4.85,-0.05 3.85,-0.05 4.35,-1.05 ; -9.5,-7.7 -9.5,7.7 9.5,7.7 9.5,-7.7 -9.5,-7.7
  text "OUT" at -4.865,-3.92 h1
  text "+V" at -4.865,-1.38 h1
  text "0" at -4.865,1.16 h1
  text "-V" at -4.865,3.7 h1
  text "+" at 5.985,2.7 h1
  text "-" at 5.985,-3.3 h1
3D body "SENS_LEM_HX 15-P.stp": height 20, standoff -4, extent -9.5,-7.7 9.5,7.7

## SENS_LEM_LA 25-NP [mm] "LEM Current Transducer, Body 29.2x26mm"
height 16.5
pads (13):
  round 1.9 hole 1.2: 1(11.16,-5.08) 2(11.16,-2.54) 3(11.16,0) 4(11.16,2.54) 5(11.16,5.08) 6(2.27,5.08) 7(2.27,2.54) 8(2.27,0) 9(2.27,-2.54) 10(2.27,-5.08)
  round 2 hole 1.3: +(-9.16,0) -(-9.16,-7.62) M(-9.16,7.62)
Top Overlay:
  lines w0.2: -14.6,-12 ccw(c-13.6,-12) -13.6,-13 13.6,-13 ccw(c13.6,-12) 14.6,-12 14.6,12 ccw(c13.6,12) 13.6,13 -13.6,13 ccw(c-13.6,12) -14.6,12 -14.6,-12
  text "10" at 3.794,-5.544 h1
  text "6" at 3.794,4.616 h1
  text "1" at 12.684,-5.539 h1
  text "5" at 12.684,4.616 h1
  text "-" at -11.589,-8.061 h1
  text "M" at -11.73,7.104 h1
  text "+" at -11.7,-0.425 h1
Notvisible:
  lines w0.1: -9.66,-7.62 -9.16,-7.62 ; -9.66,0 -9.16,0 ; -9.66,7.62 -9.16,7.62 ; -9.16,-8.12 -9.16,-7.62 ; -9.16,-7.12 -9.16,-7.62 ; -9.16,-0.5 -9.16,0 ; -9.16,0.5 -9.16,0 ; -9.16,7.12 -9.16,7.62 ; -9.16,8.12 -9.16,7.62 ; -8.66,-7.62 -9.16,-7.62 ; -8.66,0 -9.16,0 ; -8.66,7.62 -9.16,7.62 ; -0.5,0 0,0 ; 0,-0.5 0,0 ; 0,0.5 0,0 ; 0.5,0 0,0 ; 1.77,-5.08 2.27,-5.08 ; 1.77,-2.54 2.27,-2.54 ; 1.77,0 2.27,0 ; 1.77,2.54 2.27,2.54 ; 1.77,5.08 2.27,5.08 ; 2.27,-5.58 2.27,-5.08 ; 2.27,-4.58 2.27,-5.08 ; 2.27,-3.04 2.27,-2.54 ; 2.27,-2.04 2.27,-2.54 ; 2.27,-0.5 2.27,0 ; 2.27,0.5 2.27,0 ; 2.27,2.04 2.27,2.54 ; 2.27,3.04 2.27,2.54 ; 2.27,4.58 2.27,5.08 ; 2.27,5.58 2.27,5.08 ; 2.77,-5.08 2.27,-5.08 ; 2.77,-2.54 2.27,-2.54 ; 2.77,0 2.27,0 ; 2.77,2.54 2.27,2.54 ; 2.77,5.08 2.27,5.08 ; 10.66,-5.08 11.16,-5.08 ; 10.66,-2.54 11.16,-2.54 ; 10.66,0 11.16,0 ; 10.66,2.54 11.16,2.54 ; 10.66,5.08 11.16,5.08 ; 11.16,-5.58 11.16,-5.08 ; 11.16,-4.58 11.16,-5.08 ; 11.16,-3.04 11.16,-2.54 ; 11.16,-2.04 11.16,-2.54 ; 11.16,-0.5 11.16,0 ; 11.16,0.5 11.16,0 ; 11.16,2.04 11.16,2.54 ; 11.16,3.04 11.16,2.54 ; 11.16,4.58 11.16,5.08 ; 11.16,5.58 11.16,5.08 ; 11.66,-5.08 11.16,-5.08 ; 11.66,-2.54 11.16,-2.54 ; 11.66,0 11.16,0 ; 11.66,2.54 11.16,2.54 ; 11.66,5.08 11.16,5.08
Mechanical 14:
  lines w0.1: -14.6,-12 ccw(c-13.6,-12) -13.6,-13 13.6,-13 ccw(c13.6,-12) 14.6,-12 14.6,12 ccw(c13.6,12) 13.6,13 -13.6,13 ccw(c-13.6,12) -14.6,12 -14.6,-12
  text "10" at 3.794,-5.544 h1
  text "6" at 3.794,4.616 h1
  text "1" at 12.684,-5.539 h1
  text "5" at 12.684,4.616 h1
  text "+" at -11.7,-0.425 h1
  text "M" at -11.73,7.104 h1
  text "-" at -11.589,-8.061 h1
3D body "SENS_LEM_LA 25-NP.stp": height 16.5, standoff -3.8, extent -14.6,-13 14.6,13

## SENS_LEM_LA 25-NP/SP7 [mm] "LEM Current Transducer, Body 29.2x26mm"
height 16.5
pads (5):
  round 2 hole 1.3: 1(-9.16,7.62) 2(-9.16,0) 3(-9.16,-7.62)
  round 1.9 hole 1.2: 4(11.16,-7.62) 5(11.16,7.62)
Top Overlay:
  lines w0.2: -14.6,-12 ccw(c-13.6,-12) -13.6,-13 13.6,-13 ccw(c13.6,-12) 14.6,-12 14.6,12 ccw(c13.6,12) 13.6,13 -13.6,13 ccw(c-13.6,12) -14.6,12 -14.6,-12
  text "-V" at -12.589,-8.136 h1
  text "M" at -11.43,7.104 h1
  text "+V" at -12.7,-0.5 h1
  text "+" at 12.565,-7.223 h1
  text "-" at 12.684,7.231 h1
Notvisible:
  lines w0.1: -9.66,-7.62 -9.16,-7.62 ; -9.66,0 -9.16,0 ; -9.66,7.62 -9.16,7.62 ; -9.16,-8.12 -9.16,-7.62 ; -9.16,-7.12 -9.16,-7.62 ; -9.16,-0.5 -9.16,0 ; -9.16,0.5 -9.16,0 ; -9.16,7.12 -9.16,7.62 ; -9.16,8.12 -9.16,7.62 ; -8.66,-7.62 -9.16,-7.62 ; -8.66,0 -9.16,0 ; -8.66,7.62 -9.16,7.62 ; -0.5,0 0,0 ; 0,-0.5 0,0 ; 0,0.5 0,0 ; 0.5,0 0,0 ; 10.66,-7.62 11.16,-7.62 ; 10.66,7.62 11.16,7.62 ; 11.16,-8.12 11.16,-7.62 ; 11.16,-7.12 11.16,-7.62 ; 11.16,7.12 11.16,7.62 ; 11.16,8.12 11.16,7.62 ; 11.66,-7.62 11.16,-7.62 ; 11.66,7.62 11.16,7.62
Mechanical 14:
  lines w0.1: -14.6,-12 ccw(c-13.6,-12) -13.6,-13 13.6,-13 ccw(c13.6,-12) 14.6,-12 14.6,12 ccw(c13.6,12) 13.6,13 -13.6,13 ccw(c-13.6,12) -14.6,12 -14.6,-12
  text "+V" at -12.7,-0.5 h1
  text "M" at -11.43,7.104 h1
  text "-V" at -12.589,-8.136 h1
  text "+" at 12.565,-7.223 h1
  text "-" at 12.684,7.231 h1
3D body "SENS_LEM_LA 25-NP-SP7.stp": height 16.45, standoff -3, extent -14.6,-13 14.6,13

## SENS_LEM_LA 25-NP/SP14 [mm] "LEM Current Transducer, Body 29.2x26mm"
height 16.45
pads (5):
  round 2 hole 1.3: 1(-9.16,7.62) 2(-9.16,0) 3(-9.16,-7.62)
  round 1.9 hole 1.2: 4(11.16,-7.62) 5(11.16,7.62)
Top Overlay:
  lines w0.2: -14.6,-12 ccw(c-13.6,-12) -13.6,-13 13.6,-13 ccw(c13.6,-12) 14.6,-12 14.6,12 ccw(c13.6,12) 13.6,13 -13.6,13 ccw(c-13.6,12) -14.6,12 -14.6,-12
  text "-V" at -12.589,-8.136 h1
  text "M" at -11.43,7.104 h1
  text "+V" at -12.7,-0.5 h1
  text "+" at 12.565,-7.223 h1
  text "-" at 12.684,7.231 h1
Notvisible:
  lines w0.1: -9.66,-7.62 -9.16,-7.62 ; -9.66,0 -9.16,0 ; -9.66,7.62 -9.16,7.62 ; -9.16,-8.12 -9.16,-7.62 ; -9.16,-7.12 -9.16,-7.62 ; -9.16,-0.5 -9.16,0 ; -9.16,0.5 -9.16,0 ; -9.16,7.12 -9.16,7.62 ; -9.16,8.12 -9.16,7.62 ; -8.66,-7.62 -9.16,-7.62 ; -8.66,0 -9.16,0 ; -8.66,7.62 -9.16,7.62 ; -0.5,0 0,0 ; 0,-0.5 0,0 ; 0,0.5 0,0 ; 0.5,0 0,0 ; 10.66,-7.62 11.16,-7.62 ; 10.66,7.62 11.16,7.62 ; 11.16,-8.12 11.16,-7.62 ; 11.16,-7.12 11.16,-7.62 ; 11.16,7.12 11.16,7.62 ; 11.16,8.12 11.16,7.62 ; 11.66,-7.62 11.16,-7.62 ; 11.66,7.62 11.16,7.62
Mechanical 14:
  lines w0.1: -14.6,-12 ccw(c-13.6,-12) -13.6,-13 13.6,-13 ccw(c13.6,-12) 14.6,-12 14.6,12 ccw(c13.6,12) 13.6,13 -13.6,13 ccw(c-13.6,12) -14.6,12 -14.6,-12
  text "+V" at -12.7,-0.5 h1
  text "M" at -11.43,7.104 h1
  text "-V" at -12.589,-8.136 h1
  text "+" at 12.565,-7.223 h1
  text "-" at 12.684,7.231 h1
3D body "SENS_LEM_LA 25-NP-SP14.stp": height 16.45, standoff -3, extent -14.6,-13 14.6,13

## SENS_LEM_LA 100-P/SP13 [mm] "LEM Current Transducer, Body 36.5X14.45"
height 27.8
pads (3):
  round 1.8 hole 1.1: +(13.97,0.675) -(-8.89,0.675) M(-13.97,0.675)
Top Overlay:
  lines w0.2: -6.35,-7.325 -6.35,-6.5 ; -6.35,-5.5 -6.35,-4.5 ; -6.35,-3.5 -6.35,-2.5 ; -6.35,-1.5 -6.35,-0.5 ; -6.35,0.5 -6.35,1.5 ; -6.35,2.5 -6.35,3.5 ; -6.35,4.5 -6.35,5.5 ; -6.35,6.5 -6.35,7.325 ; 6.35,-7.325 6.35,-6.5 ; 6.35,-5.5 6.35,-4.5 ; 6.35,-3.5 6.35,-2.5 ; 6.35,-1.5 6.35,-0.5 ; 6.35,0.5 6.35,1.5 ; 6.35,2.5 6.35,3.5 ; 6.35,4.5 6.35,5.5 ; 6.35,6.5 6.35,7.325 ; -18.35,-6.325 ccw(c-17.35,-6.325) -17.35,-7.325 17.35,-7.325 ccw(c17.35,-6.325) 18.35,-6.325 18.35,6.325 ccw(c17.35,6.325) 17.35,7.325 -17.35,7.325 ccw(c-17.35,6.325) -18.35,6.325 -18.35,-6.325 ; -2.5,-0.5 -1,-0.5 -1,4.5 1,4.5 1,-0.5 2.5,-0.5 0,-4.5 -2.5,-0.5
  text "M" at -14.303,-2.365 h1.2
  text "-" at -9.213,-2.365 h1.2
  text "+" at 13.647,-2.365 h1.2
Notvisible:
  lines w0.1: -14.47,0.675 -13.97,0.675 ; -13.97,0.175 -13.97,0.675 ; -13.97,1.175 -13.97,0.675 ; -13.47,0.675 -13.97,0.675 ; -9.39,0.675 -8.89,0.675 ; -8.89,0.175 -8.89,0.675 ; -8.89,1.175 -8.89,0.675 ; -8.39,0.675 -8.89,0.675 ; -0.5,0 0,0 ; 0,-0.5 0,0 ; 0,0.5 0,0 ; 0.5,0 0,0 ; 13.47,0.675 13.97,0.675 ; 13.97,0.175 13.97,0.675 ; 13.97,1.175 13.97,0.675 ; 14.47,0.675 13.97,0.675
Mechanical 14:
  lines w0.1: -6.35,-7.325 -6.35,-6.5 ; -6.35,-5.5 -6.35,-4.5 ; -6.35,-3.5 -6.35,-2.5 ; -6.35,-1.5 -6.35,-0.5 ; -6.35,0.5 -6.35,1.5 ; -6.35,2.5 -6.35,3.5 ; -6.35,4.5 -6.35,5.5 ; -6.35,6.5 -6.35,7.325 ; 6.35,-7.325 6.35,-6.5 ; 6.35,-5.5 6.35,-4.5 ; 6.35,-3.5 6.35,-2.5 ; 6.35,-1.5 6.35,-0.5 ; 6.35,0.5 6.35,1.5 ; 6.35,2.5 6.35,3.5 ; 6.35,4.5 6.35,5.5 ; 6.35,6.5 6.35,7.325 ; -18.35,-6.325 ccw(c-17.35,-6.325) -17.35,-7.325 17.35,-7.325 ccw(c17.35,-6.325) 18.35,-6.325 18.35,6.325 ccw(c17.35,6.325) 17.35,7.325 -17.35,7.325 ccw(c-17.35,6.325) -18.35,6.325 -18.35,-6.325 ; -2.5,-0.5 -1,-0.5 -1,4.5 1,4.5 1,-0.5 2.5,-0.5 0,-4.5 -2.5,-0.5
  text "M" at -14.303,-2.365 h1.2
  text "-" at -9.213,-2.365 h1.2
  text "+" at 13.647,-2.365 h1.2
3D body "SENS_LEM_LA 100-P-SP13.stp": height 27.8, standoff -3.6, extent -18.35,-7.325 18.35,7.325